# Altium footprint library Connector_PinHeader_2.54mm.PcbLib: 278 footprints (part 11 of 18)
Each footprint in its own frame and in the unit in brackets; x right, y up, seen from the top. Pads: shape width x height; smd on the part's side, far side on the other; paste and mask are expansions set on the pad; w line width, h text height; cw(c..) or ccw(c..) is an arc to the next point about the centre after c.
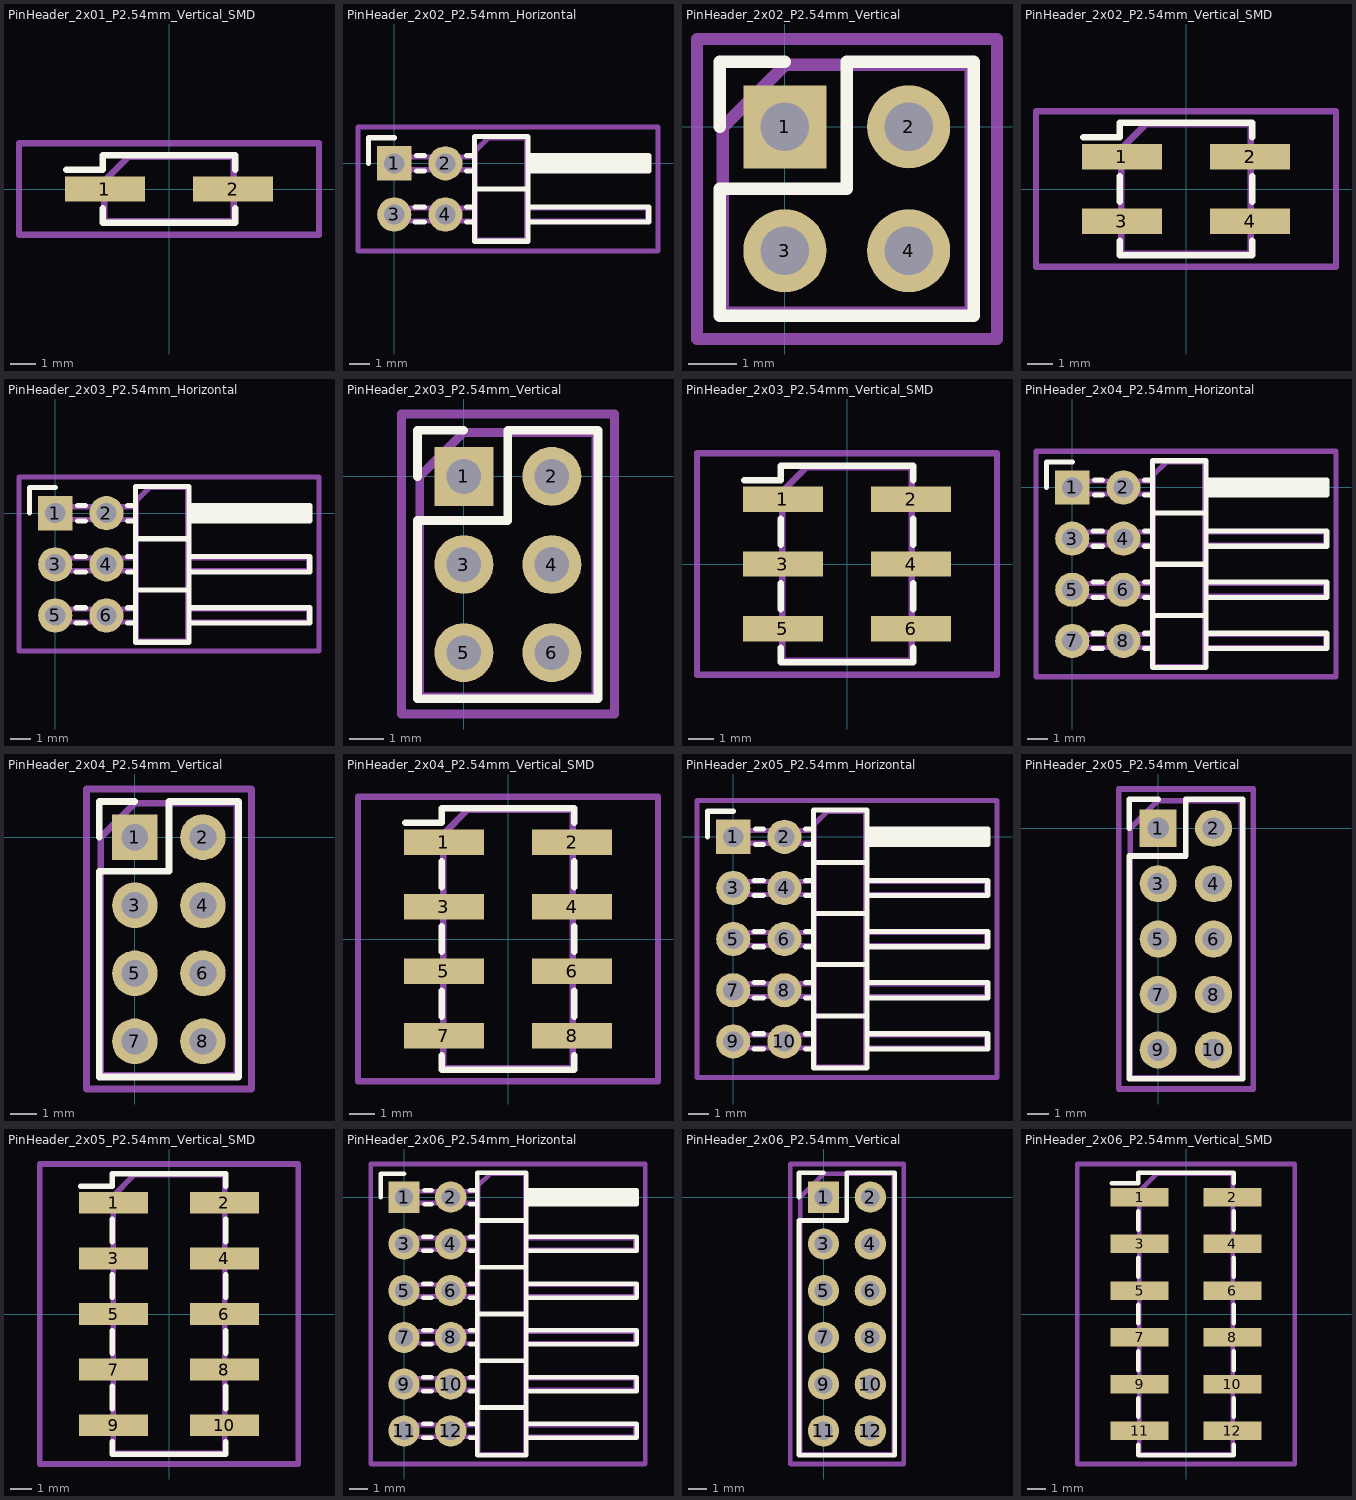
[diagram p10: the footprints below, top view; thin cyan lines are the x and y axes]

## PinHeader_2x01_P2.54mm_Vertical_SMD [mm]
pads (2):
  rect 3.15x1 smd: 1(-2.525,0) 2(2.525,0)
F.SilkS:
  lines w0.254: -4.04,0.76 -2.6,0.76 -2.6,1.33 2.6,1.33 2.6,0.76 ; -2.6,-0.76 -2.6,-1.33 2.6,-1.33 2.6,-0.76
F.CrtYd:
  lines w0.254: -5.9,-1.8 -5.9,1.8 5.9,1.8 5.9,-1.8 -5.9,-1.8
F.Fab:
  lines w0.254: -2.54,-0.32 -3.6,-0.32 -3.6,0.32 -2.54,0.32 ; 2.54,-0.32 3.6,-0.32 3.6,0.32 2.54,0.32 ; -2.54,0.32 -1.59,1.27 2.54,1.27 2.54,-1.27 -2.54,-1.27 -2.54,0.32
  text "'.Designator'" at 0.84,-4.047 h1

## PinHeader_2x02_P2.54mm_Horizontal [mm]
pads (4):
  rect 1.7x1.7 hole 1: 1(0,0)
  rrect100% 1.7x1.7 hole 1: 2(2.54,0) 3(0,-2.54) 4(2.54,-2.54)
F.SilkS:
  lines w0.254: -1.27,0 -1.27,1.27 0,1.27 ; 1.043,-2.92 1.497,-2.92 ; 1.043,-2.16 1.497,-2.16 ; 1.11,-0.38 1.497,-0.38 ; 1.11,0.38 1.497,0.38 ; 3.583,-2.92 3.98,-2.92 ; 3.583,-2.16 3.98,-2.16 ; 3.583,-0.38 3.98,-0.38 ; 3.583,0.38 3.98,0.38 ; 3.98,-1.27 6.64,-1.27 ; 6.64,-2.92 12.64,-2.92 12.64,-2.16 6.64,-2.16 ; 6.64,-0.38 12.64,-0.38 12.64,0.38 6.64,0.38 ; 6.64,-0.28 12.64,-0.28 ; 6.64,-0.16 12.64,-0.16 ; 6.64,-0.04 12.64,-0.04 ; 6.64,0.08 12.64,0.08 ; 6.64,0.2 12.64,0.2 ; 6.64,0.32 12.64,0.32 ; 3.98,-3.87 3.98,1.33 6.64,1.33 6.64,-3.87 3.98,-3.87
F.CrtYd:
  lines w0.254: -1.8,-4.35 -1.8,1.8 13.1,1.8 13.1,-4.35 -1.8,-4.35
F.Fab:
  lines w0.254: 4.04,-2.86 -0.32,-2.86 -0.32,-2.22 4.04,-2.22 ; 4.04,-0.32 -0.32,-0.32 -0.32,0.32 4.04,0.32 ; 6.58,-2.86 12.58,-2.86 12.58,-2.22 6.58,-2.22 ; 6.58,-0.32 12.58,-0.32 12.58,0.32 6.58,0.32 ; 4.04,-3.81 4.04,0.635 4.675,1.27 6.58,1.27 6.58,-3.81 4.04,-3.81
  text "'.Designator'" at 6.15,-5.317 h1

## PinHeader_2x02_P2.54mm_Vertical [mm]
pads (4):
  rect 1.7x1.7 hole 1: 1(0,0)
  rrect100% 1.7x1.7 hole 1: 2(2.54,0) 3(0,-2.54) 4(2.54,-2.54)
F.SilkS:
  lines w0.254: -1.33,0 -1.33,1.33 0,1.33 ; -1.33,-3.87 -1.33,-1.27 1.27,-1.27 1.27,1.33 3.87,1.33 3.87,-3.87 -1.33,-3.87
F.CrtYd:
  lines w0.254: -1.8,-4.35 -1.8,1.8 4.35,1.8 4.35,-4.35 -1.8,-4.35
F.Fab:
  lines w0.254: -1.27,-3.81 -1.27,0 0,1.27 3.81,1.27 3.81,-3.81 -1.27,-3.81
  text "'.Designator'" at 2.11,-5.317 h1

## PinHeader_2x02_P2.54mm_Vertical_SMD [mm]
pads (4):
  rect 3.15x1 smd: 1(-2.525,1.27) 2(2.525,1.27) 3(-2.525,-1.27) 4(2.525,-1.27)
F.SilkS:
  lines w0.254: -4.04,2.03 -2.6,2.03 -2.6,2.6 2.6,2.6 2.6,2.03 ; -2.6,-2.03 -2.6,-2.6 2.6,-2.6 2.6,-2.03 ; -2.6,-0.51 -2.6,0.51 ; 2.6,-0.51 2.6,0.51
F.CrtYd:
  lines w0.254: -5.9,-3.05 -5.9,3.05 5.9,3.05 5.9,-3.05 -5.9,-3.05
F.Fab:
  lines w0.254: -2.54,-1.59 -3.6,-1.59 -3.6,-0.95 -2.54,-0.95 ; -2.54,0.95 -3.6,0.95 -3.6,1.59 -2.54,1.59 ; 2.54,-1.59 3.6,-1.59 3.6,-0.95 2.54,-0.95 ; 2.54,0.95 3.6,0.95 3.6,1.59 2.54,1.59 ; -2.54,1.59 -1.59,2.54 2.54,2.54 2.54,-2.54 -2.54,-2.54 -2.54,1.59
  text "'.Designator'" at 0.84,-4.047 h1

## PinHeader_2x03_P2.54mm_Horizontal [mm]
pads (6):
  rect 1.7x1.7 hole 1: 1(0,0)
  rrect100% 1.7x1.7 hole 1: 2(2.54,0) 3(0,-2.54) 4(2.54,-2.54) 5(0,-5.08) 6(2.54,-5.08)
F.SilkS:
  lines w0.254: -1.27,0 -1.27,1.27 0,1.27 ; 1.043,-5.46 1.497,-5.46 ; 1.043,-4.7 1.497,-4.7 ; 1.043,-2.92 1.497,-2.92 ; 1.043,-2.16 1.497,-2.16 ; 1.11,-0.38 1.497,-0.38 ; 1.11,0.38 1.497,0.38 ; 3.583,-5.46 3.98,-5.46 ; 3.583,-4.7 3.98,-4.7 ; 3.583,-2.92 3.98,-2.92 ; 3.583,-2.16 3.98,-2.16 ; 3.583,-0.38 3.98,-0.38 ; 3.583,0.38 3.98,0.38 ; 3.98,-3.81 6.64,-3.81 ; 3.98,-1.27 6.64,-1.27 ; 6.64,-5.46 12.64,-5.46 12.64,-4.7 6.64,-4.7 ; 6.64,-2.92 12.64,-2.92 12.64,-2.16 6.64,-2.16 ; 6.64,-0.38 12.64,-0.38 12.64,0.38 6.64,0.38 ; 6.64,-0.28 12.64,-0.28 ; 6.64,-0.16 12.64,-0.16 ; 6.64,-0.04 12.64,-0.04 ; 6.64,0.08 12.64,0.08 ; 6.64,0.2 12.64,0.2 ; 6.64,0.32 12.64,0.32 ; 3.98,-6.41 3.98,1.33 6.64,1.33 6.64,-6.41 3.98,-6.41
F.CrtYd:
  lines w0.254: -1.8,-6.85 -1.8,1.8 13.1,1.8 13.1,-6.85 -1.8,-6.85
F.Fab:
  lines w0.254: 4.04,-5.4 -0.32,-5.4 -0.32,-4.76 4.04,-4.76 ; 4.04,-2.86 -0.32,-2.86 -0.32,-2.22 4.04,-2.22 ; 4.04,-0.32 -0.32,-0.32 -0.32,0.32 4.04,0.32 ; 6.58,-5.4 12.58,-5.4 12.58,-4.76 6.58,-4.76 ; 6.58,-2.86 12.58,-2.86 12.58,-2.22 6.58,-2.22 ; 6.58,-0.32 12.58,-0.32 12.58,0.32 6.58,0.32 ; 4.04,-6.35 4.04,0.635 4.675,1.27 6.58,1.27 6.58,-6.35 4.04,-6.35
  text "'.Designator'" at 6.15,-6.587 h1

## PinHeader_2x03_P2.54mm_Vertical [mm]
pads (6):
  rect 1.7x1.7 hole 1: 1(0,0)
  rrect100% 1.7x1.7 hole 1: 2(2.54,0) 3(0,-2.54) 4(2.54,-2.54) 5(0,-5.08) 6(2.54,-5.08)
F.SilkS:
  lines w0.254: -1.33,0 -1.33,1.33 0,1.33 ; -1.33,-6.41 -1.33,-1.27 1.27,-1.27 1.27,1.33 3.87,1.33 3.87,-6.41 -1.33,-6.41
F.CrtYd:
  lines w0.254: -1.8,-6.85 -1.8,1.8 4.35,1.8 4.35,-6.85 -1.8,-6.85
F.Fab:
  lines w0.254: -1.27,-6.35 -1.27,0 0,1.27 3.81,1.27 3.81,-6.35 -1.27,-6.35
  text "'.Designator'" at 2.11,-6.587 h1

## PinHeader_2x03_P2.54mm_Vertical_SMD [mm]
pads (6):
  rect 3.15x1 smd: 1(-2.525,2.54) 2(2.525,2.54) 3(-2.525,0) 4(2.525,0) 5(-2.525,-2.54) 6(2.525,-2.54)
F.SilkS:
  lines w0.254: -4.04,3.3 -2.6,3.3 -2.6,3.87 2.6,3.87 2.6,3.3 ; -2.6,-3.3 -2.6,-3.87 2.6,-3.87 2.6,-3.3 ; -2.6,-1.78 -2.6,-0.76 ; -2.6,0.76 -2.6,1.78 ; 2.6,-1.78 2.6,-0.76 ; 2.6,0.76 2.6,1.78
F.CrtYd:
  lines w0.254: -5.9,-4.35 -5.9,4.35 5.9,4.35 5.9,-4.35 -5.9,-4.35
F.Fab:
  lines w0.254: -2.54,-2.86 -3.6,-2.86 -3.6,-2.22 -2.54,-2.22 ; -2.54,-0.32 -3.6,-0.32 -3.6,0.32 -2.54,0.32 ; -2.54,2.22 -3.6,2.22 -3.6,2.86 -2.54,2.86 ; 2.54,-2.86 3.6,-2.86 3.6,-2.22 2.54,-2.22 ; 2.54,-0.32 3.6,-0.32 3.6,0.32 2.54,0.32 ; 2.54,2.22 3.6,2.22 3.6,2.86 2.54,2.86 ; -2.54,2.86 -1.59,3.81 2.54,3.81 2.54,-3.81 -2.54,-3.81 -2.54,2.86
  text "'.Designator'" at 0.84,-4.047 h1

## PinHeader_2x04_P2.54mm_Horizontal [mm]
pads (8):
  rect 1.7x1.7 hole 1: 1(0,0)
  rrect100% 1.7x1.7 hole 1: 2(2.54,0) 3(0,-2.54) 4(2.54,-2.54) 5(0,-5.08) 6(2.54,-5.08) 7(0,-7.62) 8(2.54,-7.62)
F.SilkS:
  lines w0.254: -1.27,0 -1.27,1.27 0,1.27 ; 1.043,-8 1.497,-8 ; 1.043,-7.24 1.497,-7.24 ; 1.043,-5.46 1.497,-5.46 ; 1.043,-4.7 1.497,-4.7 ; 1.043,-2.92 1.497,-2.92 ; 1.043,-2.16 1.497,-2.16 ; 1.11,-0.38 1.497,-0.38 ; 1.11,0.38 1.497,0.38 ; 3.583,-8 3.98,-8 ; 3.583,-7.24 3.98,-7.24 ; 3.583,-5.46 3.98,-5.46 ; 3.583,-4.7 3.98,-4.7 ; 3.583,-2.92 3.98,-2.92 ; 3.583,-2.16 3.98,-2.16 ; 3.583,-0.38 3.98,-0.38 ; 3.583,0.38 3.98,0.38 ; 3.98,-6.35 6.64,-6.35 ; 3.98,-3.81 6.64,-3.81 ; 3.98,-1.27 6.64,-1.27 ; 6.64,-8 12.64,-8 12.64,-7.24 6.64,-7.24 ; 6.64,-5.46 12.64,-5.46 12.64,-4.7 6.64,-4.7 ; 6.64,-2.92 12.64,-2.92 12.64,-2.16 6.64,-2.16 ; 6.64,-0.38 12.64,-0.38 12.64,0.38 6.64,0.38 ; 6.64,-0.28 12.64,-0.28 ; 6.64,-0.16 12.64,-0.16 ; 6.64,-0.04 12.64,-0.04 ; 6.64,0.08 12.64,0.08 ; 6.64,0.2 12.64,0.2 ; 6.64,0.32 12.64,0.32 ; 3.98,-8.95 3.98,1.33 6.64,1.33 6.64,-8.95 3.98,-8.95
F.CrtYd:
  lines w0.254: -1.8,-9.4 -1.8,1.8 13.1,1.8 13.1,-9.4 -1.8,-9.4
F.Fab:
  lines w0.254: 4.04,-7.94 -0.32,-7.94 -0.32,-7.3 4.04,-7.3 ; 4.04,-5.4 -0.32,-5.4 -0.32,-4.76 4.04,-4.76 ; 4.04,-2.86 -0.32,-2.86 -0.32,-2.22 4.04,-2.22 ; 4.04,-0.32 -0.32,-0.32 -0.32,0.32 4.04,0.32 ; 6.58,-7.94 12.58,-7.94 12.58,-7.3 6.58,-7.3 ; 6.58,-5.4 12.58,-5.4 12.58,-4.76 6.58,-4.76 ; 6.58,-2.86 12.58,-2.86 12.58,-2.22 6.58,-2.22 ; 6.58,-0.32 12.58,-0.32 12.58,0.32 6.58,0.32 ; 4.04,-8.89 4.04,0.635 4.675,1.27 6.58,1.27 6.58,-8.89 4.04,-8.89
  text "'.Designator'" at 6.15,-7.857 h1

## PinHeader_2x04_P2.54mm_Vertical [mm]
pads (8):
  rect 1.7x1.7 hole 1: 1(0,0)
  rrect100% 1.7x1.7 hole 1: 2(2.54,0) 3(0,-2.54) 4(2.54,-2.54) 5(0,-5.08) 6(2.54,-5.08) 7(0,-7.62) 8(2.54,-7.62)
F.SilkS:
  lines w0.254: -1.33,0 -1.33,1.33 0,1.33 ; -1.33,-8.95 -1.33,-1.27 1.27,-1.27 1.27,1.33 3.87,1.33 3.87,-8.95 -1.33,-8.95
F.CrtYd:
  lines w0.254: -1.8,-9.4 -1.8,1.8 4.35,1.8 4.35,-9.4 -1.8,-9.4
F.Fab:
  lines w0.254: -1.27,-8.89 -1.27,0 0,1.27 3.81,1.27 3.81,-8.89 -1.27,-8.89
  text "'.Designator'" at 2.11,-7.857 h1

## PinHeader_2x04_P2.54mm_Vertical_SMD [mm]
pads (8):
  rect 3.15x1 smd: 1(-2.525,3.81) 2(2.525,3.81) 3(-2.525,1.27) 4(2.525,1.27) 5(-2.525,-1.27) 6(2.525,-1.27) 7(-2.525,-3.81) 8(2.525,-3.81)
F.SilkS:
  lines w0.254: -4.04,4.57 -2.6,4.57 -2.6,5.14 2.6,5.14 2.6,4.57 ; -2.6,-4.57 -2.6,-5.14 2.6,-5.14 2.6,-4.57 ; -2.6,-3.05 -2.6,-2.03 ; -2.6,-0.51 -2.6,0.51 ; -2.6,2.03 -2.6,3.05 ; 2.6,-3.05 2.6,-2.03 ; 2.6,-0.51 2.6,0.51 ; 2.6,2.03 2.6,3.05
F.CrtYd:
  lines w0.254: -5.9,-5.6 -5.9,5.6 5.9,5.6 5.9,-5.6 -5.9,-5.6
F.Fab:
  lines w0.254: -2.54,-4.13 -3.6,-4.13 -3.6,-3.49 -2.54,-3.49 ; -2.54,-1.59 -3.6,-1.59 -3.6,-0.95 -2.54,-0.95 ; -2.54,0.95 -3.6,0.95 -3.6,1.59 -2.54,1.59 ; -2.54,3.49 -3.6,3.49 -3.6,4.13 -2.54,4.13 ; 2.54,-4.13 3.6,-4.13 3.6,-3.49 2.54,-3.49 ; 2.54,-1.59 3.6,-1.59 3.6,-0.95 2.54,-0.95 ; 2.54,0.95 3.6,0.95 3.6,1.59 2.54,1.59 ; 2.54,3.49 3.6,3.49 3.6,4.13 2.54,4.13 ; -2.54,4.13 -1.59,5.08 2.54,5.08 2.54,-5.08 -2.54,-5.08 -2.54,4.13
  text "'.Designator'" at 0.84,-4.047 h1

## PinHeader_2x05_P2.54mm_Horizontal [mm]
pads (10):
  rect 1.7x1.7 hole 1: 1(0,0)
  rrect100% 1.7x1.7 hole 1: 2(2.54,0) 3(0,-2.54) 4(2.54,-2.54) 5(0,-5.08) 6(2.54,-5.08) 7(0,-7.62) 8(2.54,-7.62) 9(0,-10.16) 10(2.54,-10.16)
F.SilkS:
  lines w0.254: -1.27,0 -1.27,1.27 0,1.27 ; 1.043,-10.54 1.497,-10.54 ; 1.043,-9.78 1.497,-9.78 ; 1.043,-8 1.497,-8 ; 1.043,-7.24 1.497,-7.24 ; 1.043,-5.46 1.497,-5.46 ; 1.043,-4.7 1.497,-4.7 ; 1.043,-2.92 1.497,-2.92 ; 1.043,-2.16 1.497,-2.16 ; 1.11,-0.38 1.497,-0.38 ; 1.11,0.38 1.497,0.38 ; 3.583,-10.54 3.98,-10.54 ; 3.583,-9.78 3.98,-9.78 ; 3.583,-8 3.98,-8 ; 3.583,-7.24 3.98,-7.24 ; 3.583,-5.46 3.98,-5.46 ; 3.583,-4.7 3.98,-4.7 ; 3.583,-2.92 3.98,-2.92 ; 3.583,-2.16 3.98,-2.16 ; 3.583,-0.38 3.98,-0.38 ; 3.583,0.38 3.98,0.38 ; 3.98,-8.89 6.64,-8.89 ; 3.98,-6.35 6.64,-6.35 ; 3.98,-3.81 6.64,-3.81 ; 3.98,-1.27 6.64,-1.27 ; 6.64,-10.54 12.64,-10.54 12.64,-9.78 6.64,-9.78 ; 6.64,-8 12.64,-8 12.64,-7.24 6.64,-7.24 ; 6.64,-5.46 12.64,-5.46 12.64,-4.7 6.64,-4.7 ; 6.64,-2.92 12.64,-2.92 12.64,-2.16 6.64,-2.16 ; 6.64,-0.38 12.64,-0.38 12.64,0.38 6.64,0.38 ; 6.64,-0.28 12.64,-0.28 ; 6.64,-0.16 12.64,-0.16 ; 6.64,-0.04 12.64,-0.04 ; 6.64,0.08 12.64,0.08 ; 6.64,0.2 12.64,0.2 ; 6.64,0.32 12.64,0.32 ; 3.98,-11.49 3.98,1.33 6.64,1.33 6.64,-11.49 3.98,-11.49
F.CrtYd:
  lines w0.254: -1.8,-11.95 -1.8,1.8 13.1,1.8 13.1,-11.95 -1.8,-11.95
F.Fab:
  lines w0.254: 4.04,-10.48 -0.32,-10.48 -0.32,-9.84 4.04,-9.84 ; 4.04,-7.94 -0.32,-7.94 -0.32,-7.3 4.04,-7.3 ; 4.04,-5.4 -0.32,-5.4 -0.32,-4.76 4.04,-4.76 ; 4.04,-2.86 -0.32,-2.86 -0.32,-2.22 4.04,-2.22 ; 4.04,-0.32 -0.32,-0.32 -0.32,0.32 4.04,0.32 ; 6.58,-10.48 12.58,-10.48 12.58,-9.84 6.58,-9.84 ; 6.58,-7.94 12.58,-7.94 12.58,-7.3 6.58,-7.3 ; 6.58,-5.4 12.58,-5.4 12.58,-4.76 6.58,-4.76 ; 6.58,-2.86 12.58,-2.86 12.58,-2.22 6.58,-2.22 ; 6.58,-0.32 12.58,-0.32 12.58,0.32 6.58,0.32 ; 4.04,-11.43 4.04,0.635 4.675,1.27 6.58,1.27 6.58,-11.43 4.04,-11.43
  text "'.Designator'" at 6.15,-9.127 h1

## PinHeader_2x05_P2.54mm_Vertical [mm]
pads (10):
  rect 1.7x1.7 hole 1: 1(0,0)
  rrect100% 1.7x1.7 hole 1: 2(2.54,0) 3(0,-2.54) 4(2.54,-2.54) 5(0,-5.08) 6(2.54,-5.08) 7(0,-7.62) 8(2.54,-7.62) 9(0,-10.16) 10(2.54,-10.16)
F.SilkS:
  lines w0.254: -1.33,0 -1.33,1.33 0,1.33 ; -1.33,-11.49 -1.33,-1.27 1.27,-1.27 1.27,1.33 3.87,1.33 3.87,-11.49 -1.33,-11.49
F.CrtYd:
  lines w0.254: -1.8,-11.95 -1.8,1.8 4.35,1.8 4.35,-11.95 -1.8,-11.95
F.Fab:
  lines w0.254: -1.27,-11.43 -1.27,0 0,1.27 3.81,1.27 3.81,-11.43 -1.27,-11.43
  text "'.Designator'" at 2.11,-9.127 h1

## PinHeader_2x05_P2.54mm_Vertical_SMD [mm]
pads (10):
  rect 3.15x1 smd: 1(-2.525,5.08) 2(2.525,5.08) 3(-2.525,2.54) 4(2.525,2.54) 5(-2.525,0) 6(2.525,0) 7(-2.525,-2.54) 8(2.525,-2.54) 9(-2.525,-5.08) 10(2.525,-5.08)
F.SilkS:
  lines w0.254: -4.04,5.84 -2.6,5.84 -2.6,6.41 2.6,6.41 2.6,5.84 ; -2.6,-5.84 -2.6,-6.41 2.6,-6.41 2.6,-5.84 ; -2.6,-4.32 -2.6,-3.3 ; -2.6,-1.78 -2.6,-0.76 ; -2.6,0.76 -2.6,1.78 ; -2.6,3.3 -2.6,4.32 ; 2.6,-4.32 2.6,-3.3 ; 2.6,-1.78 2.6,-0.76 ; 2.6,0.76 2.6,1.78 ; 2.6,3.3 2.6,4.32
F.CrtYd:
  lines w0.254: -5.9,-6.85 -5.9,6.85 5.9,6.85 5.9,-6.85 -5.9,-6.85
F.Fab:
  lines w0.254: -2.54,-5.4 -3.6,-5.4 -3.6,-4.76 -2.54,-4.76 ; -2.54,-2.86 -3.6,-2.86 -3.6,-2.22 -2.54,-2.22 ; -2.54,-0.32 -3.6,-0.32 -3.6,0.32 -2.54,0.32 ; -2.54,2.22 -3.6,2.22 -3.6,2.86 -2.54,2.86 ; -2.54,4.76 -3.6,4.76 -3.6,5.4 -2.54,5.4 ; 2.54,-5.4 3.6,-5.4 3.6,-4.76 2.54,-4.76 ; 2.54,-2.86 3.6,-2.86 3.6,-2.22 2.54,-2.22 ; 2.54,-0.32 3.6,-0.32 3.6,0.32 2.54,0.32 ; 2.54,2.22 3.6,2.22 3.6,2.86 2.54,2.86 ; 2.54,4.76 3.6,4.76 3.6,5.4 2.54,5.4 ; -2.54,5.4 -1.59,6.35 2.54,6.35 2.54,-6.35 -2.54,-6.35 -2.54,5.4
  text "'.Designator'" at 0.84,-4.047 h1

## PinHeader_2x06_P2.54mm_Horizontal [mm]
pads (12):
  rect 1.7x1.7 hole 1: 1(0,0)
  rrect100% 1.7x1.7 hole 1: 2(2.54,0) 3(0,-2.54) 4(2.54,-2.54) 5(0,-5.08) 6(2.54,-5.08) 7(0,-7.62) 8(2.54,-7.62) 9(0,-10.16) 10(2.54,-10.16) 11(0,-12.7) 12(2.54,-12.7)
F.SilkS:
  lines w0.254: -1.27,0 -1.27,1.27 0,1.27 ; 1.043,-13.08 1.497,-13.08 ; 1.043,-12.32 1.497,-12.32 ; 1.043,-10.54 1.497,-10.54 ; 1.043,-9.78 1.497,-9.78 ; 1.043,-8 1.497,-8 ; 1.043,-7.24 1.497,-7.24 ; 1.043,-5.46 1.497,-5.46 ; 1.043,-4.7 1.497,-4.7 ; 1.043,-2.92 1.497,-2.92 ; 1.043,-2.16 1.497,-2.16 ; 1.11,-0.38 1.497,-0.38 ; 1.11,0.38 1.497,0.38 ; 3.583,-13.08 3.98,-13.08 ; 3.583,-12.32 3.98,-12.32 ; 3.583,-10.54 3.98,-10.54 ; 3.583,-9.78 3.98,-9.78 ; 3.583,-8 3.98,-8 ; 3.583,-7.24 3.98,-7.24 ; 3.583,-5.46 3.98,-5.46 ; 3.583,-4.7 3.98,-4.7 ; 3.583,-2.92 3.98,-2.92 ; 3.583,-2.16 3.98,-2.16 ; 3.583,-0.38 3.98,-0.38 ; 3.583,0.38 3.98,0.38 ; 3.98,-11.43 6.64,-11.43 ; 3.98,-8.89 6.64,-8.89 ; 3.98,-6.35 6.64,-6.35 ; 3.98,-3.81 6.64,-3.81 ; 3.98,-1.27 6.64,-1.27 ; 6.64,-13.08 12.64,-13.08 12.64,-12.32 6.64,-12.32 ; 6.64,-10.54 12.64,-10.54 12.64,-9.78 6.64,-9.78 ; 6.64,-8 12.64,-8 12.64,-7.24 6.64,-7.24 ; 6.64,-5.46 12.64,-5.46 12.64,-4.7 6.64,-4.7 ; 6.64,-2.92 12.64,-2.92 12.64,-2.16 6.64,-2.16 ; 6.64,-0.38 12.64,-0.38 12.64,0.38 6.64,0.38 ; 6.64,-0.28 12.64,-0.28 ; 6.64,-0.16 12.64,-0.16 ; 6.64,-0.04 12.64,-0.04 ; 6.64,0.08 12.64,0.08 ; 6.64,0.2 12.64,0.2 ; 6.64,0.32 12.64,0.32 ; 3.98,-14.03 3.98,1.33 6.64,1.33 6.64,-14.03 3.98,-14.03
F.CrtYd:
  lines w0.254: -1.8,-14.5 -1.8,1.8 13.1,1.8 13.1,-14.5 -1.8,-14.5
F.Fab:
  lines w0.254: 4.04,-13.02 -0.32,-13.02 -0.32,-12.38 4.04,-12.38 ; 4.04,-10.48 -0.32,-10.48 -0.32,-9.84 4.04,-9.84 ; 4.04,-7.94 -0.32,-7.94 -0.32,-7.3 4.04,-7.3 ; 4.04,-5.4 -0.32,-5.4 -0.32,-4.76 4.04,-4.76 ; 4.04,-2.86 -0.32,-2.86 -0.32,-2.22 4.04,-2.22 ; 4.04,-0.32 -0.32,-0.32 -0.32,0.32 4.04,0.32 ; 6.58,-13.02 12.58,-13.02 12.58,-12.38 6.58,-12.38 ; 6.58,-10.48 12.58,-10.48 12.58,-9.84 6.58,-9.84 ; 6.58,-7.94 12.58,-7.94 12.58,-7.3 6.58,-7.3 ; 6.58,-5.4 12.58,-5.4 12.58,-4.76 6.58,-4.76 ; 6.58,-2.86 12.58,-2.86 12.58,-2.22 6.58,-2.22 ; 6.58,-0.32 12.58,-0.32 12.58,0.32 6.58,0.32 ; 4.04,-13.97 4.04,0.635 4.675,1.27 6.58,1.27 6.58,-13.97 4.04,-13.97
  text "'.Designator'" at 6.15,-10.397 h1

## PinHeader_2x06_P2.54mm_Vertical [mm]
pads (12):
  rect 1.7x1.7 hole 1: 1(0,0)
  rrect100% 1.7x1.7 hole 1: 2(2.54,0) 3(0,-2.54) 4(2.54,-2.54) 5(0,-5.08) 6(2.54,-5.08) 7(0,-7.62) 8(2.54,-7.62) 9(0,-10.16) 10(2.54,-10.16) 11(0,-12.7) 12(2.54,-12.7)
F.SilkS:
  lines w0.254: -1.33,0 -1.33,1.33 0,1.33 ; -1.33,-14.03 -1.33,-1.27 1.27,-1.27 1.27,1.33 3.87,1.33 3.87,-14.03 -1.33,-14.03
F.CrtYd:
  lines w0.254: -1.8,-14.5 -1.8,1.8 4.35,1.8 4.35,-14.5 -1.8,-14.5
F.Fab:
  lines w0.254: -1.27,-13.97 -1.27,0 0,1.27 3.81,1.27 3.81,-13.97 -1.27,-13.97
  text "'.Designator'" at 2.11,-10.397 h1

## PinHeader_2x06_P2.54mm_Vertical_SMD [mm]
pads (12):
  rect 3.15x1 smd: 1(-2.525,6.35) 2(2.525,6.35) 3(-2.525,3.81) 4(2.525,3.81) 5(-2.525,1.27) 6(2.525,1.27) 7(-2.525,-1.27) 8(2.525,-1.27) 9(-2.525,-3.81) 10(2.525,-3.81) 11(-2.525,-6.35) 12(2.525,-6.35)
F.SilkS:
  lines w0.254: -4.04,7.11 -2.6,7.11 -2.6,7.68 2.6,7.68 2.6,7.11 ; -2.6,-7.11 -2.6,-7.68 2.6,-7.68 2.6,-7.11 ; -2.6,-5.59 -2.6,-4.57 ; -2.6,-3.05 -2.6,-2.03 ; -2.6,-0.51 -2.6,0.51 ; -2.6,2.03 -2.6,3.05 ; -2.6,4.57 -2.6,5.59 ; 2.6,-5.59 2.6,-4.57 ; 2.6,-3.05 2.6,-2.03 ; 2.6,-0.51 2.6,0.51 ; 2.6,2.03 2.6,3.05 ; 2.6,4.57 2.6,5.59
F.CrtYd:
  lines w0.254: -5.9,-8.15 -5.9,8.15 5.9,8.15 5.9,-8.15 -5.9,-8.15
F.Fab:
  lines w0.254: -2.54,-6.67 -3.6,-6.67 -3.6,-6.03 -2.54,-6.03 ; -2.54,-4.13 -3.6,-4.13 -3.6,-3.49 -2.54,-3.49 ; -2.54,-1.59 -3.6,-1.59 -3.6,-0.95 -2.54,-0.95 ; -2.54,0.95 -3.6,0.95 -3.6,1.59 -2.54,1.59 ; -2.54,3.49 -3.6,3.49 -3.6,4.13 -2.54,4.13 ; -2.54,6.03 -3.6,6.03 -3.6,6.67 -2.54,6.67 ; 2.54,-6.67 3.6,-6.67 3.6,-6.03 2.54,-6.03 ; 2.54,-4.13 3.6,-4.13 3.6,-3.49 2.54,-3.49 ; 2.54,-1.59 3.6,-1.59 3.6,-0.95 2.54,-0.95 ; 2.54,0.95 3.6,0.95 3.6,1.59 2.54,1.59 ; 2.54,3.49 3.6,3.49 3.6,4.13 2.54,4.13 ; 2.54,6.03 3.6,6.03 3.6,6.67 2.54,6.67 ; -2.54,6.67 -1.59,7.62 2.54,7.62 2.54,-7.62 -2.54,-7.62 -2.54,6.67
  text "'.Designator'" at 0.84,-4.047 h1